# Altium integrated library esd_library.IntLib: 968 symbols (part 5 of 6)
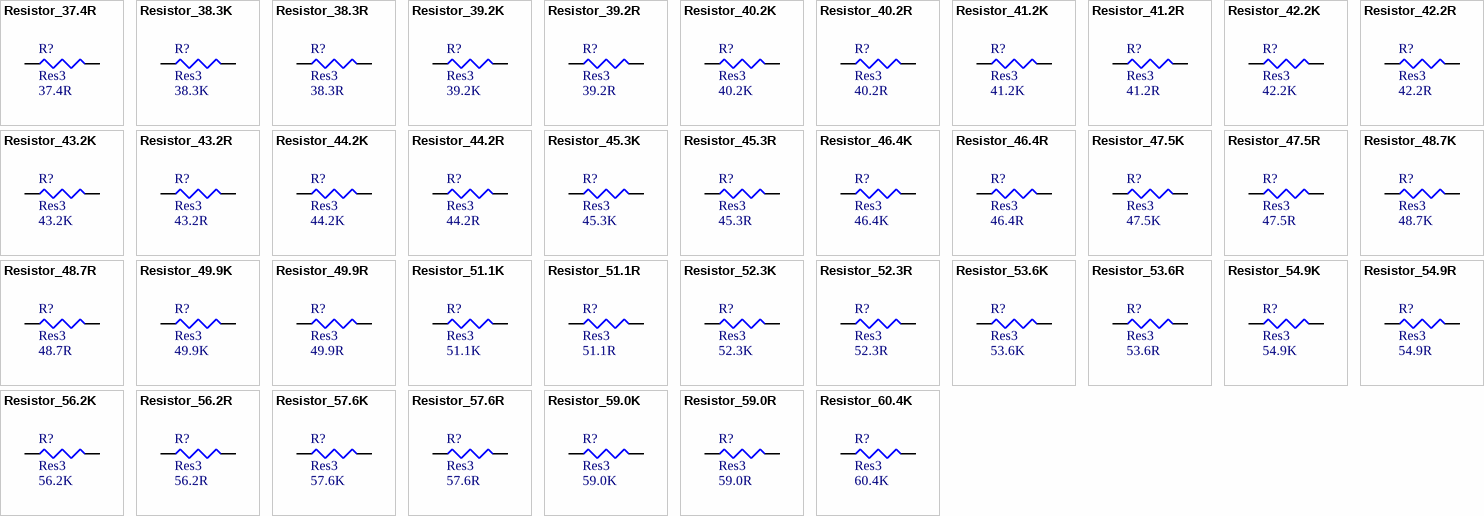
[diagram p30: symbols Resistor_37.4R to Resistor_60.4K]

## Resistor_54.9K
designator R?, comment Res3  value 54.9K
RES SMD 54.9K OHM 1% 1/8W 0805; MPN: CRCW080554K9FKEA; Name: Resistor_54.9K; PN: 541-54.9KCCT-ND; URL: http://www.digikey.ca/product-detail/en/CRCW080554K9FKEA/541-54.9KCCT-ND
footprint RESC2112X05M (Chip Resistor, 2-Leads, Body 2.05x1.25mm, IPC Low Density)
pins: 1, 2

## Resistor_54.9R
designator R?, comment Res3  value 54.9R
RES SMD 54.9R OHM 1% 1/8W 0805; MPN: CRCW080554R9FKEA; Name: Resistor_54.9R; PN: 541-54.9CCT-ND; URL: http://www.digikey.ca/product-detail/en/CRCW080554R9FKEA/541-54.9CCT-ND
footprint RESC2112X05M (Chip Resistor, 2-Leads, Body 2.05x1.25mm, IPC Low Density)
pins: 1, 2

## Resistor_56.2K
designator R?, comment Res3  value 56.2K
RES SMD 56.2K OHM 1% 1/8W 0805; MPN: CRCW080556K2FKEA; Name: Resistor_56.2K; PN: 541-56.2KCCT-ND; URL: http://www.digikey.ca/product-detail/en/CRCW080556K2FKEA/541-56.2KCCT-ND
footprint RESC2112X05M (Chip Resistor, 2-Leads, Body 2.05x1.25mm, IPC Low Density)
pins: 1, 2

## Resistor_56.2R
designator R?, comment Res3  value 56.2R
RES SMD 56.2R OHM 1% 1/8W 0805; MPN: CRCW080556R2FKEA; Name: Resistor_56.2R; PN: 541-56.2CCT-ND; URL: http://www.digikey.ca/product-detail/en/CRCW080556R2FKEA/541-56.2CCT-ND
footprint RESC2112X05M (Chip Resistor, 2-Leads, Body 2.05x1.25mm, IPC Low Density)
pins: 1, 2

## Resistor_57.6K
designator R?, comment Res3  value 57.6K
RES SMD 57.6K OHM 1% 1/8W 0805; MPN: CRCW080557K6FKEA; Name: Resistor_57.6K; PN: 541-57.6KCCT-ND; URL: http://www.digikey.ca/product-detail/en/CRCW080557K6FKEA/541-57.6KCCT-ND
footprint RESC2112X05M (Chip Resistor, 2-Leads, Body 2.05x1.25mm, IPC Low Density)
pins: 1, 2

## Resistor_57.6R
designator R?, comment Res3  value 57.6R
RES SMD 57.6R OHM 1% 1/8W 0805; MPN: CRCW080557R6FKEA; Name: Resistor_57.6R; PN: 541-57.6CCT-ND; URL: http://www.digikey.ca/product-detail/en/CRCW080557R6FKEA/541-57.6CCT-ND
footprint RESC2112X05M (Chip Resistor, 2-Leads, Body 2.05x1.25mm, IPC Low Density)
pins: 1, 2

## Resistor_59.0K
designator R?, comment Res3  value 59.0K
RES SMD 59.0K OHM 1% 1/8W 0805; MPN: CRCW080559K0FKEA; Name: Resistor_59.0K; PN: 541-59.0KCCT-ND; URL: http://www.digikey.ca/product-detail/en/CRCW080559K0FKEA/541-59.0KCCT-ND
footprint RESC2112X05M (Chip Resistor, 2-Leads, Body 2.05x1.25mm, IPC Low Density)
pins: 1, 2

## Resistor_59.0R
designator R?, comment Res3  value 59.0R
RES SMD 59.0R OHM 1% 1/8W 0805; MPN: CRCW080559R0FKEA; Name: Resistor_59.0R; PN: 541-59.0CCT-ND; URL: http://www.digikey.ca/product-detail/en/CRCW080559R0FKEA/541-59.0CCT-ND
footprint RESC2112X05M (Chip Resistor, 2-Leads, Body 2.05x1.25mm, IPC Low Density)
pins: 1, 2

## Resistor_60.4K
designator R?, comment Res3  value 60.4K
RES SMD 60.4K OHM 1% 1/8W 0805; MPN: CRCW080560K4FKEA; Name: Resistor_60.4K; PN: 541-60.4KCCT-ND; URL: http://www.digikey.ca/product-detail/en/CRCW080560K4FKEA/541-60.4KCCT-ND
footprint RESC2112X05M (Chip Resistor, 2-Leads, Body 2.05x1.25mm, IPC Low Density)
pins: 1, 2

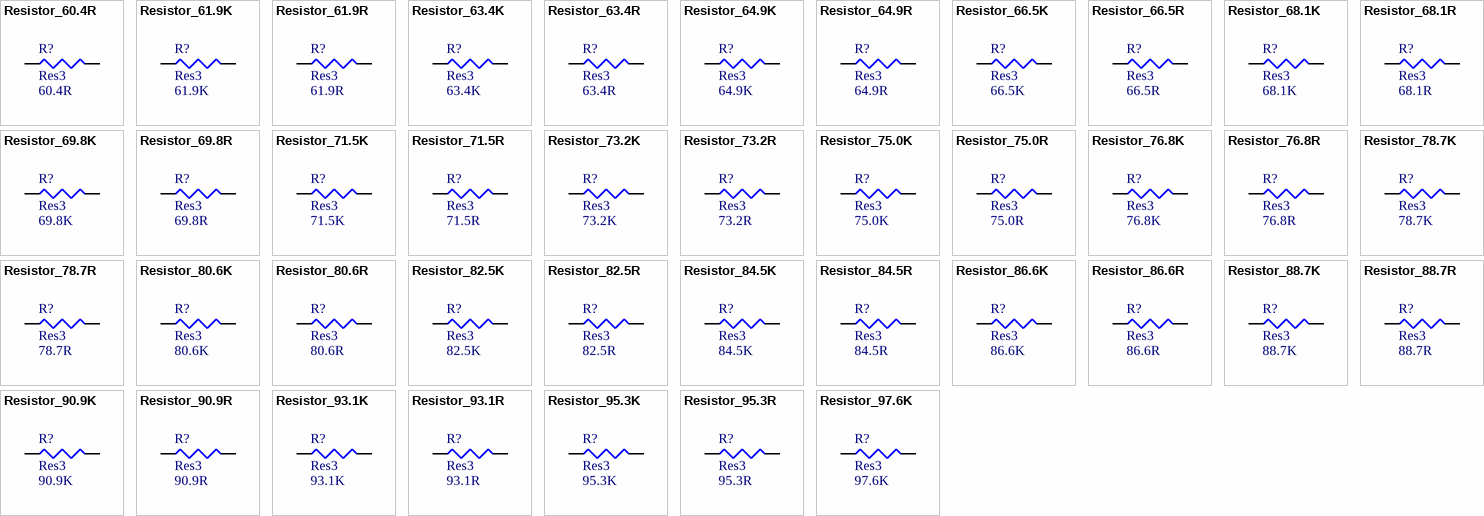
[diagram p21: symbols Resistor_60.4R to Resistor_97.6K]

## Resistor_60.4R
designator R?, comment Res3  value 60.4R
RES SMD 60.4R OHM 1% 1/8W 0805; MPN: CRCW080560R4FKEA; Name: Resistor_60.4R; PN: 541-60.4CCT-ND; URL: http://www.digikey.ca/product-detail/en/CRCW080560R4FKEA/541-60.4CCT-ND
footprint RESC2112X05M (Chip Resistor, 2-Leads, Body 2.05x1.25mm, IPC Low Density)
pins: 1, 2

## Resistor_61.9K
designator R?, comment Res3  value 61.9K
RES SMD 61.9K OHM 1% 1/8W 0805; MPN: CRCW080561K9FKEA; Name: Resistor_61.9K; PN: 541-61.9KCCT-ND; URL: http://www.digikey.ca/product-detail/en/CRCW080561K9FKEA/541-61.9KCCT-ND
footprint RESC2112X05M (Chip Resistor, 2-Leads, Body 2.05x1.25mm, IPC Low Density)
pins: 1, 2

## Resistor_61.9R
designator R?, comment Res3  value 61.9R
RES SMD 61.9R OHM 1% 1/8W 0805; MPN: CRCW080561R9FKEA; Name: Resistor_61.9R; PN: 541-61.9CCT-ND; URL: http://www.digikey.ca/product-detail/en/CRCW080561R9FKEA/541-61.9CCT-ND
footprint RESC2112X05M (Chip Resistor, 2-Leads, Body 2.05x1.25mm, IPC Low Density)
pins: 1, 2

## Resistor_63.4K
designator R?, comment Res3  value 63.4K
RES SMD 63.4K OHM 1% 1/8W 0805; MPN: CRCW080563K4FKEA; Name: Resistor_63.4K; PN: 541-63.4KCCT-ND; URL: http://www.digikey.ca/product-detail/en/CRCW080563K4FKEA/541-63.4KCCT-ND
footprint RESC2112X05M (Chip Resistor, 2-Leads, Body 2.05x1.25mm, IPC Low Density)
pins: 1, 2

## Resistor_63.4R
designator R?, comment Res3  value 63.4R
RES SMD 63.4R OHM 1% 1/8W 0805; MPN: CRCW080563R4FKEA; Name: Resistor_63.4R; PN: 541-63.4CCT-ND; URL: http://www.digikey.ca/product-detail/en/CRCW080563R4FKEA/541-63.4CCT-ND
footprint RESC2112X05M (Chip Resistor, 2-Leads, Body 2.05x1.25mm, IPC Low Density)
pins: 1, 2

## Resistor_64.9K
designator R?, comment Res3  value 64.9K
RES SMD 64.9K OHM 1% 1/8W 0805; MPN: CRCW080564K9FKEA; Name: Resistor_64.9K; PN: 541-64.9KCCT-ND; URL: http://www.digikey.ca/product-detail/en/CRCW080564K9FKEA/541-64.9KCCT-ND
footprint RESC2112X05M (Chip Resistor, 2-Leads, Body 2.05x1.25mm, IPC Low Density)
pins: 1, 2

## Resistor_64.9R
designator R?, comment Res3  value 64.9R
RES SMD 64.9R OHM 1% 1/8W 0805; MPN: CRCW080564R9FKEA; Name: Resistor_64.9R; PN: 541-64.9CCT-ND; URL: http://www.digikey.ca/product-detail/en/CRCW080564R9FKEA/541-64.9CCT-ND
footprint RESC2112X05M (Chip Resistor, 2-Leads, Body 2.05x1.25mm, IPC Low Density)
pins: 1, 2

## Resistor_66.5K
designator R?, comment Res3  value 66.5K
RES SMD 66.5K OHM 1% 1/8W 0805; MPN: CRCW080566K5FKEA; Name: Resistor_66.5K; PN: 541-66.5KCCT-ND; URL: http://www.digikey.ca/product-detail/en/CRCW080566K5FKEA/541-66.5KCCT-ND
footprint RESC2112X05M (Chip Resistor, 2-Leads, Body 2.05x1.25mm, IPC Low Density)
pins: 1, 2

## Resistor_66.5R
designator R?, comment Res3  value 66.5R
RES SMD 66.5R OHM 1% 1/8W 0805; MPN: CRCW080566R5FKEA; Name: Resistor_66.5R; PN: 541-66.5CCT-ND; URL: http://www.digikey.ca/product-detail/en/CRCW080566R5FKEA/541-66.5CCT-ND
footprint RESC2112X05M (Chip Resistor, 2-Leads, Body 2.05x1.25mm, IPC Low Density)
pins: 1, 2

## Resistor_68.1K
designator R?, comment Res3  value 68.1K
RES SMD 68.1K OHM 1% 1/8W 0805; MPN: CRCW080568K1FKEA; Name: Resistor_68.1K; PN: 541-68.1KCCT-ND; URL: http://www.digikey.ca/product-detail/en/CRCW080568K1FKEA/541-68.1KCCT-ND
footprint RESC2112X05M (Chip Resistor, 2-Leads, Body 2.05x1.25mm, IPC Low Density)
pins: 1, 2

## Resistor_68.1R
designator R?, comment Res3  value 68.1R
RES SMD 68.1R OHM 1% 1/8W 0805; MPN: CRCW080568R1FKEA; Name: Resistor_68.1R; PN: 541-68.1CCT-ND; URL: http://www.digikey.ca/product-detail/en/CRCW080568R1FKEA/541-68.1CCT-ND
footprint RESC2112X05M (Chip Resistor, 2-Leads, Body 2.05x1.25mm, IPC Low Density)
pins: 1, 2

## Resistor_69.8K
designator R?, comment Res3  value 69.8K
RES SMD 69.8K OHM 1% 1/8W 0805; MPN: CRCW080569K8FKEA; Name: Resistor_69.8K; PN: 541-69.8KCCT-ND; URL: http://www.digikey.ca/product-detail/en/CRCW080569K8FKEA/541-69.8KCCT-ND
footprint RESC2112X05M (Chip Resistor, 2-Leads, Body 2.05x1.25mm, IPC Low Density)
pins: 1, 2

## Resistor_69.8R
designator R?, comment Res3  value 69.8R
RES SMD 69.8R OHM 1% 1/8W 0805; MPN: CRCW080569R8FKEA; Name: Resistor_69.8R; PN: 541-69.8CCT-ND; URL: http://www.digikey.ca/product-detail/en/CRCW080569R8FKEA/541-69.8CCT-ND
footprint RESC2112X05M (Chip Resistor, 2-Leads, Body 2.05x1.25mm, IPC Low Density)
pins: 1, 2

## Resistor_71.5K
designator R?, comment Res3  value 71.5K
RES SMD 71.5K OHM 1% 1/8W 0805; MPN: CRCW080571K5FKEA; Name: Resistor_71.5K; PN: 541-71.5KCCT-ND; URL: http://www.digikey.ca/product-detail/en/CRCW080571K5FKEA/541-71.5KCCT-ND
footprint RESC2112X05M (Chip Resistor, 2-Leads, Body 2.05x1.25mm, IPC Low Density)
pins: 1, 2

## Resistor_71.5R
designator R?, comment Res3  value 71.5R
RES SMD 71.5R OHM 1% 1/8W 0805; MPN: CRCW080571R5FKEA; Name: Resistor_71.5R; PN: 541-71.5CCT-ND; URL: http://www.digikey.ca/product-detail/en/CRCW080571R5FKEA/541-71.5CCT-ND
footprint RESC2112X05M (Chip Resistor, 2-Leads, Body 2.05x1.25mm, IPC Low Density)
pins: 1, 2

## Resistor_73.2K
designator R?, comment Res3  value 73.2K
RES SMD 73.2K OHM 1% 1/8W 0805; MPN: CRCW080573K2FKEA; Name: Resistor_73.2K; PN: 541-73.2KCCT-ND; URL: http://www.digikey.ca/product-detail/en/CRCW080573K2FKEA/541-73.2KCCT-ND
footprint RESC2112X05M (Chip Resistor, 2-Leads, Body 2.05x1.25mm, IPC Low Density)
pins: 1, 2

## Resistor_73.2R
designator R?, comment Res3  value 73.2R
RES SMD 73.2R OHM 1% 1/8W 0805; MPN: CRCW080573R2FKEA; Name: Resistor_73.2R; PN: 541-73.2CCT-ND; URL: http://www.digikey.ca/product-detail/en/CRCW080573R2FKEA/541-73.2CCT-ND
footprint RESC2112X05M (Chip Resistor, 2-Leads, Body 2.05x1.25mm, IPC Low Density)
pins: 1, 2

## Resistor_75.0K
designator R?, comment Res3  value 75.0K
RES SMD 75.0K OHM 1% 1/8W 0805; MPN: CRCW080575K0FKEA; Name: Resistor_75.0K; PN: 541-75.0KCCT-ND; URL: http://www.digikey.ca/product-detail/en/CRCW080575K0FKEA/541-75.0KCCT-ND
footprint RESC2112X05M (Chip Resistor, 2-Leads, Body 2.05x1.25mm, IPC Low Density)
pins: 1, 2

## Resistor_75.0R
designator R?, comment Res3  value 75.0R
RES SMD 75.0R OHM 1% 1/8W 0805; MPN: CRCW080575R0FKEA; Name: Resistor_75.0R; PN: 541-75.0CCT-ND; URL: http://www.digikey.ca/product-detail/en/CRCW080575R0FKEA/541-75.0CCT-ND
footprint RESC2112X05M (Chip Resistor, 2-Leads, Body 2.05x1.25mm, IPC Low Density)
pins: 1, 2

## Resistor_76.8K
designator R?, comment Res3  value 76.8K
RES SMD 76.8K OHM 1% 1/8W 0805; MPN: CRCW080576K8FKEA; Name: Resistor_76.8K; PN: 541-76.8KCCT-ND; URL: http://www.digikey.ca/product-detail/en/CRCW080576K8FKEA/541-76.8KCCT-ND
footprint RESC2112X05M (Chip Resistor, 2-Leads, Body 2.05x1.25mm, IPC Low Density)
pins: 1, 2

## Resistor_76.8R
designator R?, comment Res3  value 76.8R
RES SMD 76.8R OHM 1% 1/8W 0805; MPN: CRCW080576R8FKEA; Name: Resistor_76.8R; PN: 541-76.8CCT-ND; URL: http://www.digikey.ca/product-detail/en/CRCW080576R8FKEA/541-76.8CCT-ND
footprint RESC2112X05M (Chip Resistor, 2-Leads, Body 2.05x1.25mm, IPC Low Density)
pins: 1, 2

## Resistor_78.7K
designator R?, comment Res3  value 78.7K
RES SMD 78.7K OHM 1% 1/8W 0805; MPN: CRCW080578K7FKEA; Name: Resistor_78.7K; PN: 541-78.7KCCT-ND; URL: http://www.digikey.ca/product-detail/en/CRCW080578K7FKEA/541-78.7KCCT-ND
footprint RESC2112X05M (Chip Resistor, 2-Leads, Body 2.05x1.25mm, IPC Low Density)
pins: 1, 2

## Resistor_78.7R
designator R?, comment Res3  value 78.7R
RES SMD 78.7R OHM 1% 1/8W 0805; MPN: CRCW080578R7FKEA; Name: Resistor_78.7R; PN: 541-78.7CCT-ND; URL: http://www.digikey.ca/product-detail/en/CRCW080578R7FKEA/541-78.7CCT-ND
footprint RESC2112X05M (Chip Resistor, 2-Leads, Body 2.05x1.25mm, IPC Low Density)
pins: 1, 2

## Resistor_80.6K
designator R?, comment Res3  value 80.6K
RES SMD 80.6K OHM 1% 1/8W 0805; MPN: CRCW080580K6FKEA; Name: Resistor_80.6K; PN: 541-80.6KCCT-ND; URL: http://www.digikey.ca/product-detail/en/CRCW080580K6FKEA/541-80.6KCCT-ND
footprint RESC2112X05M (Chip Resistor, 2-Leads, Body 2.05x1.25mm, IPC Low Density)
pins: 1, 2

## Resistor_80.6R
designator R?, comment Res3  value 80.6R
RES SMD 80.6R OHM 1% 1/8W 0805; MPN: CRCW080580R6FKEA; Name: Resistor_80.6R; PN: 541-80.6CCT-ND; URL: http://www.digikey.ca/product-detail/en/CRCW080580R6FKEA/541-80.6CCT-ND
footprint RESC2112X05M (Chip Resistor, 2-Leads, Body 2.05x1.25mm, IPC Low Density)
pins: 1, 2

## Resistor_82.5K
designator R?, comment Res3  value 82.5K
RES SMD 82.5K OHM 1% 1/8W 0805; MPN: CRCW080582K5FKEA; Name: Resistor_82.5K; PN: 541-82.5KCCT-ND; URL: http://www.digikey.ca/product-detail/en/CRCW080582K5FKEA/541-82.5KCCT-ND
footprint RESC2112X05M (Chip Resistor, 2-Leads, Body 2.05x1.25mm, IPC Low Density)
pins: 1, 2

## Resistor_82.5R
designator R?, comment Res3  value 82.5R
RES SMD 82.5R OHM 1% 1/8W 0805; MPN: CRCW080582R5FKEA; Name: Resistor_82.5R; PN: 541-82.5CCT-ND; URL: http://www.digikey.ca/product-detail/en/CRCW080582R5FKEA/541-82.5CCT-ND
footprint RESC2112X05M (Chip Resistor, 2-Leads, Body 2.05x1.25mm, IPC Low Density)
pins: 1, 2

## Resistor_84.5K
designator R?, comment Res3  value 84.5K
RES SMD 84.5K OHM 1% 1/8W 0805; MPN: CRCW080584K5FKEA; Name: Resistor_84.5K; PN: 541-84.5KCCT-ND; URL: http://www.digikey.ca/product-detail/en/CRCW080584K5FKEA/541-84.5KCCT-ND
footprint RESC2112X05M (Chip Resistor, 2-Leads, Body 2.05x1.25mm, IPC Low Density)
pins: 1, 2

## Resistor_84.5R
designator R?, comment Res3  value 84.5R
RES SMD 84.5R OHM 1% 1/8W 0805; MPN: CRCW080584R5FKEA; Name: Resistor_84.5R; PN: 541-84.5CCT-ND; URL: http://www.digikey.ca/product-detail/en/CRCW080584R5FKEA/541-84.5CCT-ND
footprint RESC2112X05M (Chip Resistor, 2-Leads, Body 2.05x1.25mm, IPC Low Density)
pins: 1, 2

## Resistor_86.6K
designator R?, comment Res3  value 86.6K
RES SMD 86.6K OHM 1% 1/8W 0805; MPN: CRCW080586K6FKEA; Name: Resistor_86.6K; PN: 541-86.6KCCT-ND; URL: http://www.digikey.ca/product-detail/en/CRCW080586K6FKEA/541-86.6KCCT-ND
footprint RESC2112X05M (Chip Resistor, 2-Leads, Body 2.05x1.25mm, IPC Low Density)
pins: 1, 2

## Resistor_86.6R
designator R?, comment Res3  value 86.6R
RES SMD 86.6R OHM 1% 1/8W 0805; MPN: CRCW080586R6FKEA; Name: Resistor_86.6R; PN: 541-86.6CCT-ND; URL: http://www.digikey.ca/product-detail/en/CRCW080586R6FKEA/541-86.6CCT-ND
footprint RESC2112X05M (Chip Resistor, 2-Leads, Body 2.05x1.25mm, IPC Low Density)
pins: 1, 2

## Resistor_88.7K
designator R?, comment Res3  value 88.7K
RES SMD 88.7K OHM 1% 1/8W 0805; MPN: CRCW080588K7FKEA; Name: Resistor_88.7K; PN: 541-88.7KCCT-ND; URL: http://www.digikey.ca/product-detail/en/CRCW080588K7FKEA/541-88.7KCCT-ND
footprint RESC2112X05M (Chip Resistor, 2-Leads, Body 2.05x1.25mm, IPC Low Density)
pins: 1, 2

## Resistor_88.7R
designator R?, comment Res3  value 88.7R
RES SMD 88.7R OHM 1% 1/8W 0805; MPN: CRCW080588R7FKEA; Name: Resistor_88.7R; PN: 541-88.7CCT-ND; URL: http://www.digikey.ca/product-detail/en/CRCW080588R7FKEA/541-88.7CCT-ND
footprint RESC2112X05M (Chip Resistor, 2-Leads, Body 2.05x1.25mm, IPC Low Density)
pins: 1, 2

## Resistor_90.9K
designator R?, comment Res3  value 90.9K
RES SMD 90.9K OHM 1% 1/8W 0805; MPN: CRCW080590K9FKEA; Name: Resistor_90.9K; PN: 541-90.9KCCT-ND; URL: http://www.digikey.ca/product-detail/en/CRCW080590K9FKEA/541-90.9KCCT-ND
footprint RESC2112X05M (Chip Resistor, 2-Leads, Body 2.05x1.25mm, IPC Low Density)
pins: 1, 2

## Resistor_90.9R
designator R?, comment Res3  value 90.9R
RES SMD 90.9R OHM 1% 1/8W 0805; MPN: CRCW080590R9FKEA; Name: Resistor_90.9R; PN: 541-90.9CCT-ND; URL: http://www.digikey.ca/product-detail/en/CRCW080590R9FKEA/541-90.9CCT-ND
footprint RESC2112X05M (Chip Resistor, 2-Leads, Body 2.05x1.25mm, IPC Low Density)
pins: 1, 2

## Resistor_93.1K
designator R?, comment Res3  value 93.1K
RES SMD 93.1K OHM 1% 1/8W 0805; MPN: CRCW080593K1FKEA; Name: Resistor_93.1K; PN: 541-93.1KCCT-ND; URL: http://www.digikey.ca/product-detail/en/CRCW080593K1FKEA/541-93.1KCCT-ND
footprint RESC2112X05M (Chip Resistor, 2-Leads, Body 2.05x1.25mm, IPC Low Density)
pins: 1, 2

## Resistor_93.1R
designator R?, comment Res3  value 93.1R
RES SMD 93.1R OHM 1% 1/8W 0805; MPN: CRCW080593R1FKEA; Name: Resistor_93.1R; PN: 541-93.1CCT-ND; URL: http://www.digikey.ca/product-detail/en/CRCW080593R1FKEA/541-93.1CCT-ND
footprint RESC2112X05M (Chip Resistor, 2-Leads, Body 2.05x1.25mm, IPC Low Density)
pins: 1, 2

## Resistor_95.3K
designator R?, comment Res3  value 95.3K
RES SMD 95.3K OHM 1% 1/8W 0805; MPN: CRCW080595K3FKEA; Name: Resistor_95.3K; PN: 541-95.3KCCT-ND; URL: http://www.digikey.ca/product-detail/en/CRCW080595K3FKEA/541-95.3KCCT-ND
footprint RESC2112X05M (Chip Resistor, 2-Leads, Body 2.05x1.25mm, IPC Low Density)
pins: 1, 2

## Resistor_95.3R
designator R?, comment Res3  value 95.3R
RES SMD 95.3R OHM 1% 1/8W 0805; MPN: CRCW080595R3FKEA; Name: Resistor_95.3R; PN: 541-95.3CCT-ND; URL: http://www.digikey.ca/product-detail/en/CRCW080595R3FKEA/541-95.3CCT-ND
footprint RESC2112X05M (Chip Resistor, 2-Leads, Body 2.05x1.25mm, IPC Low Density)
pins: 1, 2

## Resistor_97.6K
designator R?, comment Res3  value 97.6K
RES SMD 97.6K OHM 1% 1/8W 0805; MPN: CRCW080597K6FKEA; Name: Resistor_97.6K; PN: 541-97.6KCCT-ND; URL: http://www.digikey.ca/product-detail/en/CRCW080597K6FKEA/541-97.6KCCT-ND
footprint RESC2112X05M (Chip Resistor, 2-Leads, Body 2.05x1.25mm, IPC Low Density)
pins: 1, 2

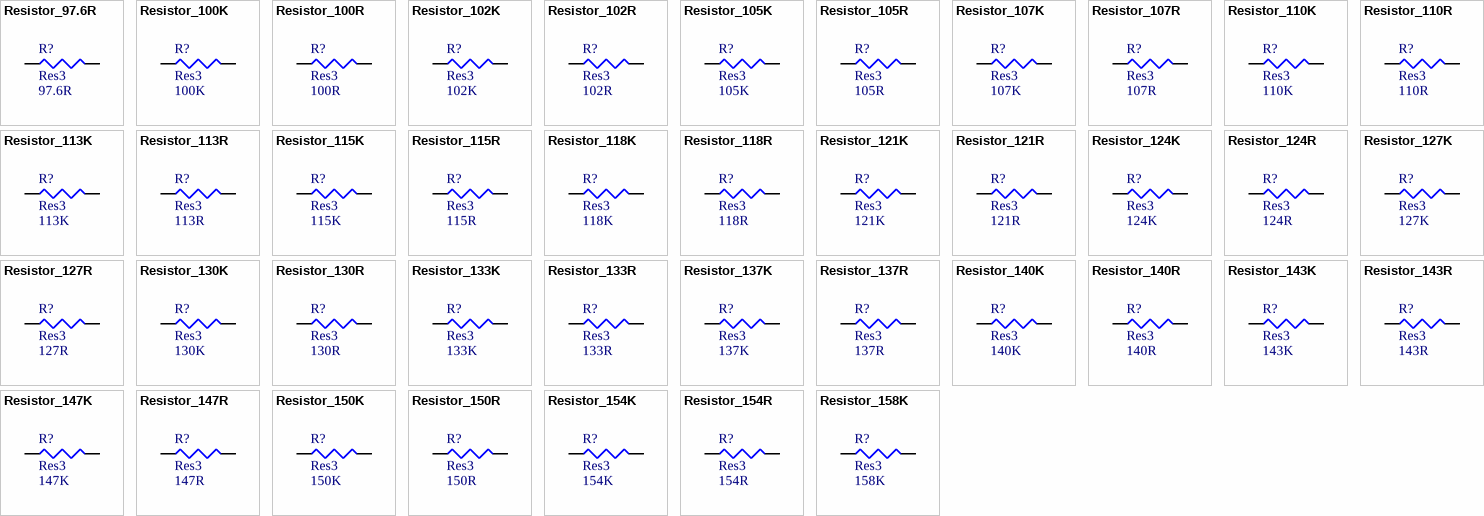
[diagram p22: symbols Resistor_97.6R to Resistor_158K]

## Resistor_97.6R
designator R?, comment Res3  value 97.6R
RES SMD 97.6R OHM 1% 1/8W 0805; MPN: CRCW080597R6FKEA; Name: Resistor_97.6R; PN: 541-97.6CCT-ND; URL: http://www.digikey.ca/product-detail/en/CRCW080597R6FKEA/541-97.6CCT-ND
footprint RESC2112X05M (Chip Resistor, 2-Leads, Body 2.05x1.25mm, IPC Low Density)
pins: 1, 2

## Resistor_100K
designator R?, comment Res3  value 100K
RES SMD 100K OHM 1% 1/8W 0805; MPN: CRCW0805100KFKEA; Name: Resistor_100K; PN: 541-100KCCT-ND; URL: http://www.digikey.ca/product-detail/en/CRCW0805100KFKEA/541-100KCCT-ND
footprint RESC2112X05M (Chip Resistor, 2-Leads, Body 2.05x1.25mm, IPC Low Density)
pins: 1, 2

## Resistor_100R
designator R?, comment Res3  value 100R
RES SMD 100R OHM 1% 1/8W 0805; MPN: CRCW0805100RFKEA; Name: Resistor_100R; PN: 541-100CCT-ND; URL: http://www.digikey.ca/product-detail/en/CRCW0805100RFKEA/541-100CCT-ND
footprint RESC2112X05M (Chip Resistor, 2-Leads, Body 2.05x1.25mm, IPC Low Density)
pins: 1, 2

## Resistor_102K
designator R?, comment Res3  value 102K
RES SMD 102K OHM 1% 1/8W 0805; MPN: CRCW0805102KFKEA; Name: Resistor_102K; PN: 541-102KCCT-ND; URL: http://www.digikey.ca/product-detail/en/CRCW0805102KFKEA/541-102KCCT-ND
footprint RESC2112X05M (Chip Resistor, 2-Leads, Body 2.05x1.25mm, IPC Low Density)
pins: 1, 2

## Resistor_102R
designator R?, comment Res3  value 102R
RES SMD 102R OHM 1% 1/8W 0805; MPN: CRCW0805102RFKEA; Name: Resistor_102R; PN: 541-102CCT-ND; URL: http://www.digikey.ca/product-detail/en/CRCW0805102RFKEA/541-102CCT-ND
footprint RESC2112X05M (Chip Resistor, 2-Leads, Body 2.05x1.25mm, IPC Low Density)
pins: 1, 2

## Resistor_105K
designator R?, comment Res3  value 105K
RES SMD 105K OHM 1% 1/8W 0805; MPN: CRCW0805105KFKEA; Name: Resistor_105K; PN: 541-105KCCT-ND; URL: http://www.digikey.ca/product-detail/en/CRCW0805105KFKEA/541-105KCCT-ND
footprint RESC2112X05M (Chip Resistor, 2-Leads, Body 2.05x1.25mm, IPC Low Density)
pins: 1, 2

## Resistor_105R
designator R?, comment Res3  value 105R
RES SMD 105R OHM 1% 1/8W 0805; MPN: CRCW0805105RFKEA; Name: Resistor_105R; PN: 541-105CCT-ND; URL: http://www.digikey.ca/product-detail/en/CRCW0805105RFKEA/541-105CCT-ND
footprint RESC2112X05M (Chip Resistor, 2-Leads, Body 2.05x1.25mm, IPC Low Density)
pins: 1, 2

## Resistor_107K
designator R?, comment Res3  value 107K
RES SMD 107K OHM 1% 1/8W 0805; MPN: CRCW0805107KFKEA; Name: Resistor_107K; PN: 541-107KCCT-ND; URL: http://www.digikey.ca/product-detail/en/CRCW0805107KFKEA/541-107KCCT-ND
footprint RESC2112X05M (Chip Resistor, 2-Leads, Body 2.05x1.25mm, IPC Low Density)
pins: 1, 2

## Resistor_107R
designator R?, comment Res3  value 107R
RES SMD 107R OHM 1% 1/8W 0805; MPN: CRCW0805107RFKEA; Name: Resistor_107R; PN: 541-107CCT-ND; URL: http://www.digikey.ca/product-detail/en/CRCW0805107RFKEA/541-107CCT-ND
footprint RESC2112X05M (Chip Resistor, 2-Leads, Body 2.05x1.25mm, IPC Low Density)
pins: 1, 2

## Resistor_110K
designator R?, comment Res3  value 110K
RES SMD 110K OHM 1% 1/8W 0805; MPN: CRCW0805110KFKEA; Name: Resistor_110K; PN: 541-110KCCT-ND; URL: http://www.digikey.ca/product-detail/en/CRCW0805110KFKEA/541-110KCCT-ND
footprint RESC2112X05M (Chip Resistor, 2-Leads, Body 2.05x1.25mm, IPC Low Density)
pins: 1, 2

## Resistor_110R
designator R?, comment Res3  value 110R
RES SMD 110R OHM 1% 1/8W 0805; MPN: CRCW0805110RFKEA; Name: Resistor_110R; PN: 541-110CCT-ND; URL: http://www.digikey.ca/product-detail/en/CRCW0805110RFKEA/541-110CCT-ND
footprint RESC2112X05M (Chip Resistor, 2-Leads, Body 2.05x1.25mm, IPC Low Density)
pins: 1, 2

## Resistor_113K
designator R?, comment Res3  value 113K
RES SMD 113K OHM 1% 1/8W 0805; MPN: CRCW0805113KFKEA; Name: Resistor_113K; PN: 541-113KCCT-ND; URL: http://www.digikey.ca/product-detail/en/CRCW0805113KFKEA/541-113KCCT-ND
footprint RESC2112X05M (Chip Resistor, 2-Leads, Body 2.05x1.25mm, IPC Low Density)
pins: 1, 2

## Resistor_113R
designator R?, comment Res3  value 113R
RES SMD 113R OHM 1% 1/8W 0805; MPN: CRCW0805113RFKEA; Name: Resistor_113R; PN: 541-113CCT-ND; URL: http://www.digikey.ca/product-detail/en/CRCW0805113RFKEA/541-113CCT-ND
footprint RESC2112X05M (Chip Resistor, 2-Leads, Body 2.05x1.25mm, IPC Low Density)
pins: 1, 2

## Resistor_115K
designator R?, comment Res3  value 115K
RES SMD 115K OHM 1% 1/8W 0805; MPN: CRCW0805115KFKEA; Name: Resistor_115K; PN: 541-115KCCT-ND; URL: http://www.digikey.ca/product-detail/en/CRCW0805115KFKEA/541-115KCCT-ND
footprint RESC2112X05M (Chip Resistor, 2-Leads, Body 2.05x1.25mm, IPC Low Density)
pins: 1, 2

## Resistor_115R
designator R?, comment Res3  value 115R
RES SMD 115R OHM 1% 1/8W 0805; MPN: CRCW0805115RFKEA; Name: Resistor_115R; PN: 541-115CCT-ND; URL: http://www.digikey.ca/product-detail/en/CRCW0805115RFKEA/541-115CCT-ND
footprint RESC2112X05M (Chip Resistor, 2-Leads, Body 2.05x1.25mm, IPC Low Density)
pins: 1, 2

## Resistor_118K
designator R?, comment Res3  value 118K
RES SMD 118K OHM 1% 1/8W 0805; MPN: CRCW0805118KFKEA; Name: Resistor_118K; PN: 541-118KCCT-ND; URL: http://www.digikey.ca/product-detail/en/CRCW0805118KFKEA/541-118KCCT-ND
footprint RESC2112X05M (Chip Resistor, 2-Leads, Body 2.05x1.25mm, IPC Low Density)
pins: 1, 2

## Resistor_118R
designator R?, comment Res3  value 118R
RES SMD 118R OHM 1% 1/8W 0805; MPN: CRCW0805118RFKEA; Name: Resistor_118R; PN: 541-118CCT-ND; URL: http://www.digikey.ca/product-detail/en/CRCW0805118RFKEA/541-118CCT-ND
footprint RESC2112X05M (Chip Resistor, 2-Leads, Body 2.05x1.25mm, IPC Low Density)
pins: 1, 2

## Resistor_121K
designator R?, comment Res3  value 121K
RES SMD 121K OHM 1% 1/8W 0805; MPN: CRCW0805121KFKEA; Name: Resistor_121K; PN: 541-121KCCT-ND; URL: http://www.digikey.ca/product-detail/en/CRCW0805121KFKEA/541-121KCCT-ND
footprint RESC2112X05M (Chip Resistor, 2-Leads, Body 2.05x1.25mm, IPC Low Density)
pins: 1, 2

## Resistor_121R
designator R?, comment Res3  value 121R
RES SMD 121R OHM 1% 1/8W 0805; MPN: CRCW0805121RFKEA; Name: Resistor_121R; PN: 541-121CCT-ND; URL: http://www.digikey.ca/product-detail/en/CRCW0805121RFKEA/541-121CCT-ND
footprint RESC2112X05M (Chip Resistor, 2-Leads, Body 2.05x1.25mm, IPC Low Density)
pins: 1, 2

## Resistor_124K
designator R?, comment Res3  value 124K
RES SMD 124K OHM 1% 1/8W 0805; MPN: CRCW0805124KFKEA; Name: Resistor_124K; PN: 541-124KCCT-ND; URL: http://www.digikey.ca/product-detail/en/CRCW0805124KFKEA/541-124KCCT-ND
footprint RESC2112X05M (Chip Resistor, 2-Leads, Body 2.05x1.25mm, IPC Low Density)
pins: 1, 2

## Resistor_124R
designator R?, comment Res3  value 124R
RES SMD 124R OHM 1% 1/8W 0805; MPN: CRCW0805124RFKEA; Name: Resistor_124R; PN: 541-124CCT-ND; URL: http://www.digikey.ca/product-detail/en/CRCW0805124RFKEA/541-124CCT-ND
footprint RESC2112X05M (Chip Resistor, 2-Leads, Body 2.05x1.25mm, IPC Low Density)
pins: 1, 2

## Resistor_127K
designator R?, comment Res3  value 127K
RES SMD 127K OHM 1% 1/8W 0805; MPN: CRCW0805127KFKEA; Name: Resistor_127K; PN: 541-127KCCT-ND; URL: http://www.digikey.ca/product-detail/en/CRCW0805127KFKEA/541-127KCCT-ND
footprint RESC2112X05M (Chip Resistor, 2-Leads, Body 2.05x1.25mm, IPC Low Density)
pins: 1, 2

## Resistor_127R
designator R?, comment Res3  value 127R
RES SMD 127R OHM 1% 1/8W 0805; MPN: CRCW0805127RFKEA; Name: Resistor_127R; PN: 541-127CCT-ND; URL: http://www.digikey.ca/product-detail/en/CRCW0805127RFKEA/541-127CCT-ND
footprint RESC2112X05M (Chip Resistor, 2-Leads, Body 2.05x1.25mm, IPC Low Density)
pins: 1, 2

## Resistor_130K
designator R?, comment Res3  value 130K
RES SMD 130K OHM 1% 1/8W 0805; MPN: CRCW0805130KFKEA; Name: Resistor_130K; PN: 541-130KCCT-ND; URL: http://www.digikey.ca/product-detail/en/CRCW0805130KFKEA/541-130KCCT-ND
footprint RESC2112X05M (Chip Resistor, 2-Leads, Body 2.05x1.25mm, IPC Low Density)
pins: 1, 2

## Resistor_130R
designator R?, comment Res3  value 130R
RES SMD 130R OHM 1% 1/8W 0805; MPN: CRCW0805130RFKEA; Name: Resistor_130R; PN: 541-130CCT-ND; URL: http://www.digikey.ca/product-detail/en/CRCW0805130RFKEA/541-130CCT-ND
footprint RESC2112X05M (Chip Resistor, 2-Leads, Body 2.05x1.25mm, IPC Low Density)
pins: 1, 2

## Resistor_133K
designator R?, comment Res3  value 133K
RES SMD 133K OHM 1% 1/8W 0805; MPN: CRCW0805133KFKEA; Name: Resistor_133K; PN: 541-133KCCT-ND; URL: http://www.digikey.ca/product-detail/en/CRCW0805133KFKEA/541-133KCCT-ND
footprint RESC2112X05M (Chip Resistor, 2-Leads, Body 2.05x1.25mm, IPC Low Density)
pins: 1, 2

## Resistor_133R
designator R?, comment Res3  value 133R
RES SMD 133R OHM 1% 1/8W 0805; MPN: CRCW0805133RFKEA; Name: Resistor_133R; PN: 541-133CCT-ND; URL: http://www.digikey.ca/product-detail/en/CRCW0805133RFKEA/541-133CCT-ND
footprint RESC2112X05M (Chip Resistor, 2-Leads, Body 2.05x1.25mm, IPC Low Density)
pins: 1, 2

## Resistor_137K
designator R?, comment Res3  value 137K
RES SMD 137K OHM 1% 1/8W 0805; MPN: CRCW0805137KFKEA; Name: Resistor_137K; PN: 541-137KCCT-ND; URL: http://www.digikey.ca/product-detail/en/CRCW0805137KFKEA/541-137KCCT-ND
footprint RESC2112X05M (Chip Resistor, 2-Leads, Body 2.05x1.25mm, IPC Low Density)
pins: 1, 2

## Resistor_137R
designator R?, comment Res3  value 137R
RES SMD 137R OHM 1% 1/8W 0805; MPN: CRCW0805137RFKEA; Name: Resistor_137R; PN: 541-137CCT-ND; URL: http://www.digikey.ca/product-detail/en/CRCW0805137RFKEA/541-137CCT-ND
footprint RESC2112X05M (Chip Resistor, 2-Leads, Body 2.05x1.25mm, IPC Low Density)
pins: 1, 2

## Resistor_140K
designator R?, comment Res3  value 140K
RES SMD 140K OHM 1% 1/8W 0805; MPN: CRCW0805140KFKEA; Name: Resistor_140K; PN: 541-140KCCT-ND; URL: http://www.digikey.ca/product-detail/en/CRCW0805140KFKEA/541-140KCCT-ND
footprint RESC2112X05M (Chip Resistor, 2-Leads, Body 2.05x1.25mm, IPC Low Density)
pins: 1, 2

## Resistor_140R
designator R?, comment Res3  value 140R
RES SMD 140R OHM 1% 1/8W 0805; MPN: CRCW0805140RFKEA; Name: Resistor_140R; PN: 541-140CCT-ND; URL: http://www.digikey.ca/product-detail/en/CRCW0805140RFKEA/541-140CCT-ND
footprint RESC2112X05M (Chip Resistor, 2-Leads, Body 2.05x1.25mm, IPC Low Density)
pins: 1, 2

## Resistor_143K
designator R?, comment Res3  value 143K
RES SMD 143K OHM 1% 1/8W 0805; MPN: CRCW0805143KFKEA; Name: Resistor_143K; PN: 541-143KCCT-ND; URL: http://www.digikey.ca/product-detail/en/CRCW0805143KFKEA/541-143KCCT-ND
footprint RESC2112X05M (Chip Resistor, 2-Leads, Body 2.05x1.25mm, IPC Low Density)
pins: 1, 2

## Resistor_143R
designator R?, comment Res3  value 143R
RES SMD 143R OHM 1% 1/8W 0805; MPN: CRCW0805143RFKEA; Name: Resistor_143R; PN: 541-143CCT-ND; URL: http://www.digikey.ca/product-detail/en/CRCW0805143RFKEA/541-143CCT-ND
footprint RESC2112X05M (Chip Resistor, 2-Leads, Body 2.05x1.25mm, IPC Low Density)
pins: 1, 2

## Resistor_147K
designator R?, comment Res3  value 147K
RES SMD 147K OHM 1% 1/8W 0805; MPN: CRCW0805147KFKEA; Name: Resistor_147K; PN: 541-147KCCT-ND; URL: http://www.digikey.ca/product-detail/en/CRCW0805147KFKEA/541-147KCCT-ND
footprint RESC2112X05M (Chip Resistor, 2-Leads, Body 2.05x1.25mm, IPC Low Density)
pins: 1, 2

## Resistor_147R
designator R?, comment Res3  value 147R
RES SMD 147R OHM 1% 1/8W 0805; MPN: CRCW0805147RFKEA; Name: Resistor_147R; PN: 541-147CCT-ND; URL: http://www.digikey.ca/product-detail/en/CRCW0805147RFKEA/541-147CCT-ND
footprint RESC2112X05M (Chip Resistor, 2-Leads, Body 2.05x1.25mm, IPC Low Density)
pins: 1, 2

## Resistor_150K
designator R?, comment Res3  value 150K
RES SMD 150K OHM 1% 1/8W 0805; MPN: CRCW0805150KFKEA; Name: Resistor_150K; PN: 541-150KCCT-ND; URL: http://www.digikey.ca/product-detail/en/CRCW0805150KFKEA/541-150KCCT-ND
footprint RESC2112X05M (Chip Resistor, 2-Leads, Body 2.05x1.25mm, IPC Low Density)
pins: 1, 2

## Resistor_150R
designator R?, comment Res3  value 150R
RES SMD 150R OHM 1% 1/8W 0805; MPN: CRCW0805150RFKEA; Name: Resistor_150R; PN: 541-150CCT-ND; URL: http://www.digikey.ca/product-detail/en/CRCW0805150RFKEA/541-150CCT-ND
footprint RESC2112X05M (Chip Resistor, 2-Leads, Body 2.05x1.25mm, IPC Low Density)
pins: 1, 2

## Resistor_154K
designator R?, comment Res3  value 154K
RES SMD 154K OHM 1% 1/8W 0805; MPN: CRCW0805154KFKEA; Name: Resistor_154K; PN: 541-154KCCT-ND; URL: http://www.digikey.ca/product-detail/en/CRCW0805154KFKEA/541-154KCCT-ND
footprint RESC2112X05M (Chip Resistor, 2-Leads, Body 2.05x1.25mm, IPC Low Density)
pins: 1, 2

## Resistor_154R
designator R?, comment Res3  value 154R
RES SMD 154R OHM 1% 1/8W 0805; MPN: CRCW0805154RFKEA; Name: Resistor_154R; PN: 541-154CCT-ND; URL: http://www.digikey.ca/product-detail/en/CRCW0805154RFKEA/541-154CCT-ND
footprint RESC2112X05M (Chip Resistor, 2-Leads, Body 2.05x1.25mm, IPC Low Density)
pins: 1, 2

## Resistor_158K
designator R?, comment Res3  value 158K
RES SMD 158K OHM 1% 1/8W 0805; MPN: CRCW0805158KFKEA; Name: Resistor_158K; PN: 541-158KCCT-ND; URL: http://www.digikey.ca/product-detail/en/CRCW0805158KFKEA/541-158KCCT-ND
footprint RESC2112X05M (Chip Resistor, 2-Leads, Body 2.05x1.25mm, IPC Low Density)
pins: 1, 2

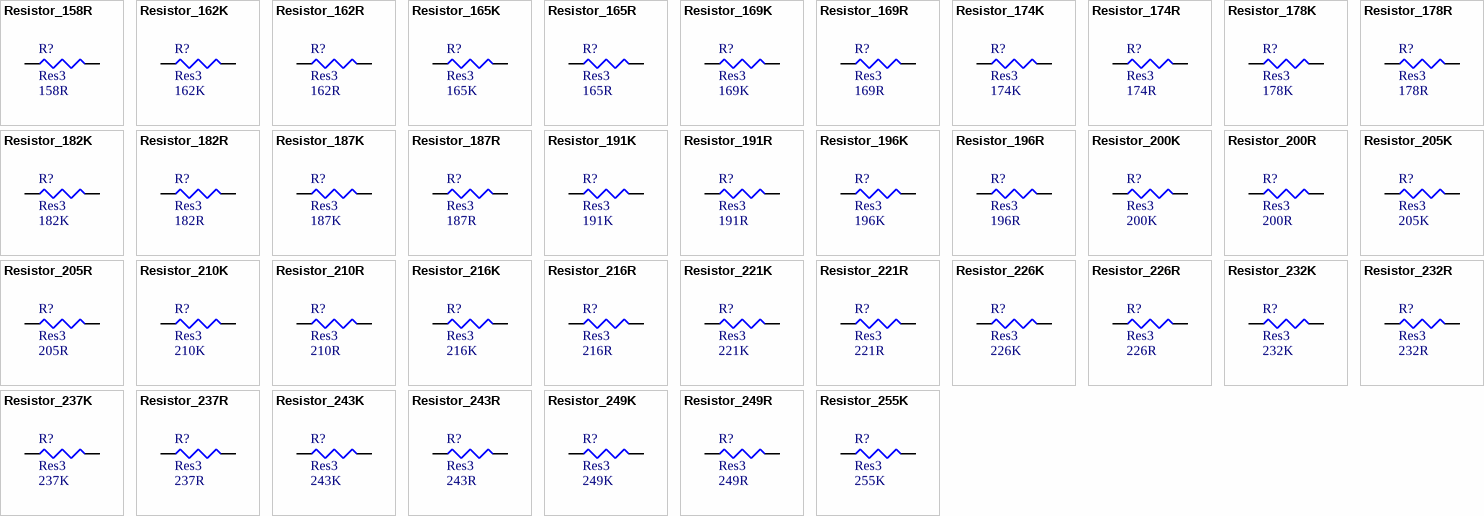
[diagram p23: symbols Resistor_158R to Resistor_255K]

## Resistor_158R
designator R?, comment Res3  value 158R
RES SMD 158R OHM 1% 1/8W 0805; MPN: CRCW0805158RFKEA; Name: Resistor_158R; PN: 541-158CCT-ND; URL: http://www.digikey.ca/product-detail/en/CRCW0805158RFKEA/541-158CCT-ND
footprint RESC2112X05M (Chip Resistor, 2-Leads, Body 2.05x1.25mm, IPC Low Density)
pins: 1, 2

## Resistor_162K
designator R?, comment Res3  value 162K
RES SMD 162K OHM 1% 1/8W 0805; MPN: CRCW0805162KFKEA; Name: Resistor_162K; PN: 541-162KCCT-ND; URL: http://www.digikey.ca/product-detail/en/CRCW0805162KFKEA/541-162KCCT-ND
footprint RESC2112X05M (Chip Resistor, 2-Leads, Body 2.05x1.25mm, IPC Low Density)
pins: 1, 2

## Resistor_162R
designator R?, comment Res3  value 162R
RES SMD 162R OHM 1% 1/8W 0805; MPN: CRCW0805162RFKEA; Name: Resistor_162R; PN: 541-162CCT-ND; URL: http://www.digikey.ca/product-detail/en/CRCW0805162RFKEA/541-162CCT-ND
footprint RESC2112X05M (Chip Resistor, 2-Leads, Body 2.05x1.25mm, IPC Low Density)
pins: 1, 2

## Resistor_165K
designator R?, comment Res3  value 165K